# Altium footprint library MyLibrarySum.PcbLib: 208 footprints (part 9 of 13)
Each footprint in its own frame and in the unit in brackets; x right, y up, seen from the top. Pads: shape width x height; smd on the part's side, far side on the other; paste and mask are expansions set on the pad; w line width, h text height; cw(c..) or ccw(c..) is an arc to the next point about the centre after c.
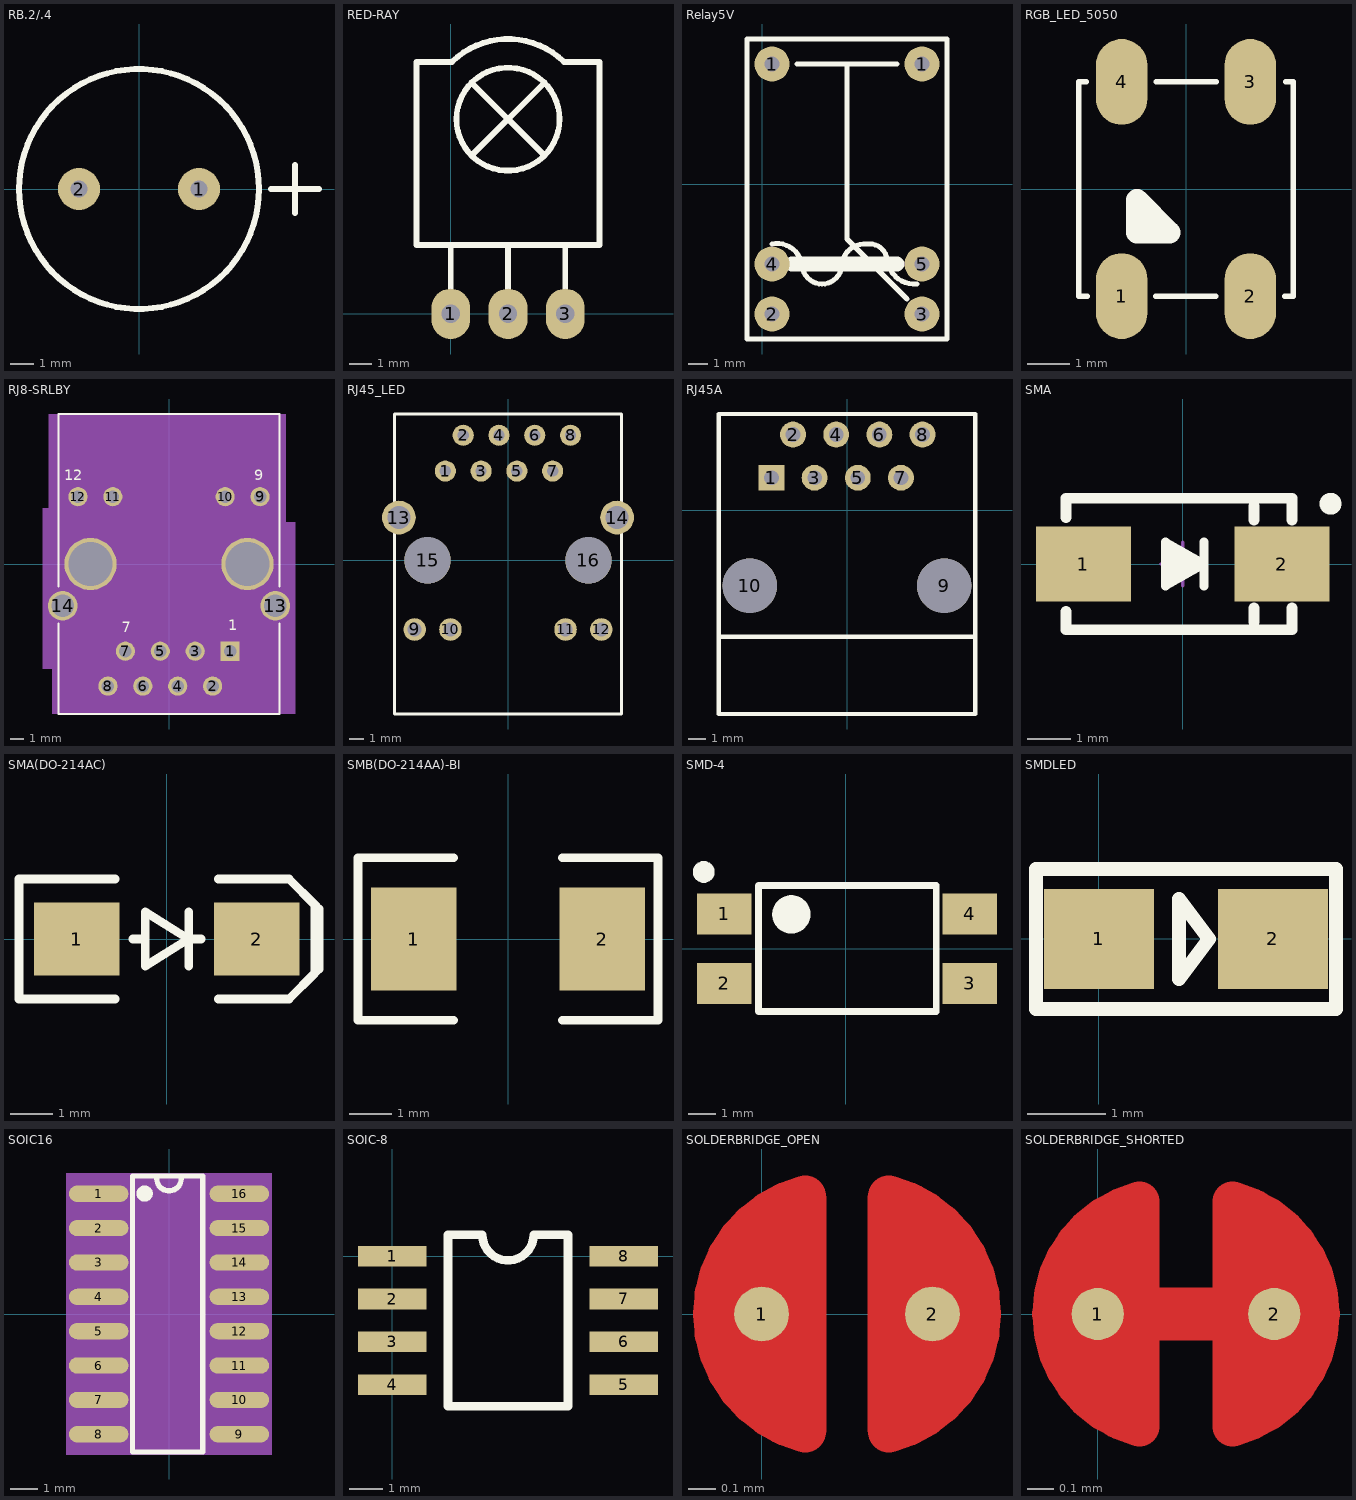
[diagram p8: the footprints below, top view; thin cyan lines are the x and y axes]

## RB.2/.4 [mil]
pads (2):
  round 70 hole 28: 1(100,0) 2(-100,0)
Top Overlay:
  circle w10: c0,0 r200
  lines w10: 220,0 300,0 ; 260,-40 260,40
3D body: height 512.81, standoff -136.91, extent -200,-195.7 195.7,200

## RED-RAY [mm]
pads (3):
  oval 1.7x2.2 hole 0.8: 1(0,0) 2(2.5,0) 3(5,0)
Top Overlay:
  circle w0.254: c2.5,8.5 r2.25
  lines w0.254: 0,1.1 0,3 ; 0.9,6.9 4.1,10.1 ; 0.9,10.1 4.1,6.9 ; 2.5,1.1 2.5,3 ; 4.947,11.002 ccw(c2.5,8.5) 0.053,11.002 -1.501,11.001 -1.5,3 6.5,3 6.5,11 4.948,11.002 ; 5,1.1 5,3

## Relay5V [mil]
pads (6):
  round 70 hole 30: 1(20,240) 1(320,240) 2(20,-260) 3(320,-260) 4(20,-160) 5(320,-160)
Top Overlay:
  lines w10: 20,-120 cw(c30,-170) 80,-160 ccw(c120,-160) 120,-200 ccw(c120,-160) 160,-160 cw(c205,-165) 210,-120 cw(c215,-155) 250,-150 ccw(c305,-145) 310,-200 ; 70,240 270,240 ; 170,240 170,-110 290,-230 ; -30,-310 370,-310 370,290 -30,290 -30,-310
  lines w30: 60,-160 270,-160
3D body: height 0, standoff -566.93, extent -40,-300 373.39,310.24

## RGB_LED_5050 [mm]
pads (4):
  oval 1.2x2 smd: 1(-1.5,-2.5) 2(1.5,-2.5) 3(1.5,2.5) 4(-1.5,2.5)
Top Overlay:
  lines w0.127: -2.326,2.5 -2.5,2.5 -2.5,-2.5 -2.3,-2.5 ; -0.711,-2.5 0.697,-2.5 ; -0.697,2.5 0.711,2.5 ; 2.3,-2.5 2.5,-2.5 2.5,2.5 2.326,2.5
  lines w0.508: -1.143,-1.016 -0.381,-1.016 -1.143,-0.254 -1.143,-1.016
3D body: height 1.55, standoff -0.02, extent -5,-5 5,5

## RJ8-SRLBY [mil] "RJ8-SRLBY"
pads (16):
  rect 55x55 hole 36: 1(175,-250)
  round 55 hole 36: 2(125,-350) 3(75,-250) 4(25,-350) 5(-25,-250) 6(-75,-350) 7(-125,-250) 8(-175,-350) 9(260.98,192.99) 10(160.98,192.99) 11(-160.98,192.99) 12(-260.98,192.99)
  round 85 hole 65: 13(305,-120) 14(-305,-120)
  round 150 hole 126: " "(-225,0) " "(225,0)
Top Overlay:
  lines w5.98: -317.01,-170 -317.01,-430 317.01,-430 317.01,-170 ; -317.01,-65 -317.01,430 317.01,430 317.01,-65
  text "1" at 170,-190 h30
  text "7" at -135,-195 h30
  text "9" at 245,240 h30
  text "12" at -300,240 h30
Mechanical 11:
  text "7" at -125,-240 h25
  text "13" at 305,-100 h25
  text "14" at -305,-100 h25
  text "8" at -175,-340 h25
  text "9" at 260.98,202.99 h25
  text "12" at -260.99,212.99 h25
  text "10" at 160.98,212.99 h25
  text "1" at 175,-240 h25
  text "2" at 125,-340 h25
  text "5" at -25,-240 h25
  text "4" at 25,-340 h25
  text "11" at -160.99,212.99 h25
  text "3" at 75,-240 h25
  text "6" at -75,-340 h25
Mechanical 12:
  lines w5.98: -317.01,-430 -317.01,430 317.01,430 317.01,-430 -317.01,-430
  text ".Designator" at -210,555 h30
Mechanical 13:
  region: -345,430 335,430 335,120 362.01,120 362.01,-430 -335,-430 -335,-300 -362.01,-300 -362.01,160 -345,160

## RJ45_LED [mm]
pads (16):
  round 1.5 hole 0.8: 1(-4.45,6.35) 2(-3.18,8.89) 3(-1.91,6.35) 4(-0.64,8.89) 5(0.63,6.35) 6(1.9,8.89) 7(3.17,6.35) 8(4.44,8.89)
  round 1.6 hole 1: 9(-6.625,-4.9) 10(-4.085,-4.9) 11(4.085,-4.9) 12(6.625,-4.9)
  round 2.4 hole 1.65: 13(-7.745,3.05) 14(7.745,3.05)
  round 3.3 hole 3.3 unplated: 15(-5.715,0) 16(5.715,0)
Top Overlay:
  lines w0.2: -8.05,-10.9 -8.05,10.4 8.05,10.4 8.05,-10.9 -8.05,-10.9
3D body: height 13.5, standoff -3, extent -7.93,-11.005 7.95,10.395

## RJ45A [mil]
pads (10):
  rect 60x60 hole 34 mask+2: 1(-175,75)
  round 60 hole 34 mask+2: 2(-125,175) 3(-75,75) 4(-25,175) 5(25,75) 6(75,175) 7(125,75) 8(175,175)
  round 125.98 hole 125.98 unplated mask+2: 9(225,-175) 10(-225,-175)
Top Overlay:
  lines w10: -297.23,222.65 -297.23,-293.44 297.21,-293.44 297.21,222.65 -297.23,222.65 ; -297.24,222.64 -297.24,-472.24 297.24,-472.24 297.24,222.64 -297.24,222.64
Mechanical 16:
  lines w5: -256.5,-175 cw(c-225,-175) -193.5,-175 cw(c-225,-175) -256.5,-175 ; -175,60.24 cw(c-175,75) -175,89.76 cw(c-175,75) -175,60.24 ; -125,160.24 ccw(c-125,175) -125,189.76 ccw(c-125,175) -125,160.24 ; -75,60.24 ccw(c-75,75) -75,89.76 ccw(c-75,75) -75,60.24 ; -25,160.24 ccw(c-25,175) -25,189.76 ccw(c-25,175) -25,160.24 ; 25,60.24 ccw(c25,75) 25,89.76 ccw(c25,75) 25,60.24 ; 75,160.24 ccw(c75,175) 75,189.76 ccw(c75,175) 75,160.24 ; 125,60.24 ccw(c125,75) 125,89.76 ccw(c125,75) 125,60.24 ; 175,160.24 ccw(c175,175) 175,189.76 ccw(c175,175) 175,160.24 ; 193.5,-175 ccw(c225,-175) 256.5,-175 ccw(c225,-175) 193.5,-175

## SMA [mm] "4.5x2.6*2.2mm（长宽高，不包括引脚）"
height 2.54
pads (2):
  rect 2.2x1.75 smd: 1(-2.3,0) 2(2.3,0)
Top Overlay:
  circle w0.254: c3.429,1.397 r0.127
  lines w0.203: 0.494,-0.508 0.494,0.508 ; -0.395,-0.508 -0.395,0.508 0.494,0 -0.395,-0.508
  lines w0.254: -2.7,-1.105 -2.7,-1.524 2.54,-1.524 2.54,-1.016 ; -2.7,1.08 -2.7,1.524 2.54,1.524 2.54,1.016 ; -0.33,0.305 0.305,0 -0.254,-0.305 -0.254,0.051 0.023,0 ; 1.651,-1.35 1.651,-1.016 ; 1.651,1.016 1.651,1.35
Mechanical 15:
  lines w0.076: -0.508,0 0.494,0 ; 0,-0.508 0,0.508
3D body: height 2.15, standoff 0.04, extent -2.528,-1.3 2.575,1.3

## SMA(DO-214AC) [mm]
height 2.2
pads (2):
  rect 2x1.7 smd: 1(-2.1,0) 2(2.1,0)
Top Overlay:
  lines w0.2: -1.2,-1.4 -3.45,-1.4 -3.45,1.4 -1.2,1.4 ; -0.8,0 -0.508,0 ; 0.508,-0.635 0.508,0.635 ; 0.8,0 0.508,0 ; 1.2,-1.4 2.85,-1.4 3.45,-0.8 3.45,0.8 ; 1.2,1.4 2.85,1.4 3.45,0.8 ; 3.375,-0.875 3.55,-0.7 3.55,0.7 3.45,0.8 ; 0.508,0 -0.508,0.635 -0.508,-0.635 0.508,0
3D body: height 2.7, standoff 0, extent -2.8,-1.475 2.8,1.475

## SMB(DO-214AA)-BI [mm]
pads (2):
  rect 2x2.4 smd: 1(-2.2,0) 2(2.2,0)
Top Overlay:
  lines w0.2: -1.27,-1.9 -3.5,-1.9 -3.5,1.9 -1.27,1.9 ; 1.27,-1.9 3.5,-1.9 3.5,1.9 1.27,1.9
3D body: height 2.3, standoff 0, extent -2.7,-1.8 2.7,1.8

## SMD-4 [mm] "SOP-4_L6.4-W4.6-P2.54-LS10.2-TL"
pads (4):
  rect 2x1.5 smd: 1(-4.445,1.27) 2(-4.445,-1.27) 3(4.521,-1.27) 4(4.521,1.27)
Top Overlay:
  lines w0.254: -3.2,-2.3 -3.2,2.3 3.3,2.3 3.3,-2.3 -3.2,-2.3
  lines w0.4: -5.2,3 ccw(c-5.198,2.8) -5.197,3
  lines w0.7: -1.999,1.6 ccw(c-1.997,1.25) -1.994,1.6

## SMDLED [mm]
pads (2):
  rect 1.4x1.27 smd: 1(0.001,-0.002) 2(2.211,-0.002)
Top Overlay:
  lines w0.178: 3.012,0.887 3.011,0.887 ; 3.011,0.887 -0.799,0.887 -0.799,-0.002 -0.799,-0.891 3.011,-0.891 3.011,0.887 ; 1.017,-0.51 1.398,-0.002 1.017,0.506 1.017,-0.51
3D body: height 1.1, standoff 0, extent 0.133,-0.635 2.153,0.615

## SOIC16 [mm] "SOIC16"
pads (16):
  oval 2.2x0.6 smd: 1(-2.6,4.445) 2(-2.6,3.175) 3(-2.6,1.905) 4(-2.6,0.635) 5(-2.6,-0.635) 6(-2.6,-1.905) 7(-2.6,-3.175) 8(-2.6,-4.445) 9(2.6,-4.445) 10(2.6,-3.175) 11(2.6,-1.905) 12(2.6,-0.635) 13(2.6,0.635) 14(2.6,1.905) 15(2.6,3.175) 16(2.6,4.445)
Top Overlay:
  circle w0.3: c-0.9,4.45 r0.15
  lines w0.2: -0.45,5 ccw(c0,5) 0.45,5 ; -1.35,-5.1 -1.35,5.1 -1.3,5.1 1.25,5.1 1.25,-5.1 -1.35,-5.1
Mechanical 11:
  text "15" at 2.6,2.769 h0.51
  text "14" at 2.6,1.499 h0.51
  text "5" at -2.6,-0.838 h0.51
  text "2" at -2.6,2.972 h0.51
  text "13" at 2.6,0.229 h0.51
  text "4" at -2.6,0.432 h0.51
  text "6" at -2.6,-2.108 h0.51
  text "8" at -2.6,-4.648 h0.51
  text "7" at -2.6,-3.378 h0.51
  text "16" at 2.6,4.039 h0.51
  text "9" at 2.6,-4.648 h0.51
  text "10" at 2.6,-3.581 h0.51
  text "1" at -2.6,4.242 h0.51
  text "12" at 2.6,-1.041 h0.51
  text "11" at 2.6,-2.311 h0.51
  text "3" at -2.6,1.702 h0.51
Mechanical 13:
  region: -3.8,-5.2 3.8,-5.2 3.8,5.2 -3.8,5.2
3D body: height 1.95, standoff 0, extent -3.008,-5.15 3.048,5.15

## SOIC-8 [mil]
pads (8):
  rect 80x24 smd: 1(0,0) 2(0,-50.06) 3(0,-100.06) 4(0,-150.06) 5(270,-150) 6(270,-100) 7(270,-50) 8(270,0)
Top Overlay:
  lines w10: 75,24.94 75.06,25 105,25 ccw(c135,25) 165,25 204.94,25 205,24.94 205,-175.06 65,-175.06 65,24.94 95,24.94
3D body: height 62.99, standoff 0, extent 6.07,-172.64 243.93,25

## SOLDERBRIDGE_OPEN [mm]
pads (2):
  round 0.2 smd paste-10: 1(0,0) 2(0.625,0)
Top Layer:
  region: 0.236,-0.432 0.16,-0.505 0.042,-0.467 -0.023,-0.424 -0.097,-0.351 -0.15,-0.292 -0.208,-0.193 -0.236,-0.099 -0.231,0.122 -0.206,0.193 -0.122,0.33 -0.038,0.411 0.054,0.469 0.155,0.5 0.206,0.483 0.236,0.43
  region: 0.389,0.432 0.465,0.505 0.583,0.467 0.648,0.424 0.721,0.351 0.775,0.292 0.833,0.193 0.861,0.099 0.856,-0.122 0.831,-0.193 0.747,-0.33 0.663,-0.411 0.571,-0.469 0.47,-0.5 0.419,-0.483 0.389,-0.43
  lines w0.152: 0.159,-0.431 cw(c0.27,0) -0.175,0 cw(c0.27,0) 0.159,0.431 ; 0.465,-0.431 ccw(c0.355,0) 0.799,0 ccw(c0.355,0) 0.465,0.431
Top Solder:
  circle w0.61: c0.31,0 r0.279

## SOLDERBRIDGE_SHORTED [mm]
pads (2):
  round 0.2 smd paste-10: 1(0,0) 2(0.676,0)
Top Layer:
  region: 0.236,-0.432 0.16,-0.505 0.042,-0.467 -0.023,-0.424 -0.097,-0.351 -0.15,-0.292 -0.208,-0.193 -0.236,-0.099 -0.231,0.122 -0.206,0.193 -0.122,0.33 -0.038,0.411 0.054,0.469 0.155,0.5 0.206,0.483 0.236,0.43
  region: 0.44,0.432 0.516,0.505 0.634,0.467 0.699,0.424 0.772,0.351 0.826,0.292 0.884,0.193 0.912,0.099 0.907,-0.122 0.881,-0.193 0.798,-0.33 0.714,-0.411 0.622,-0.469 0.521,-0.5 0.47,-0.483 0.44,-0.43
  lines w0.152: 0.159,-0.431 cw(c0.27,0) -0.175,0 cw(c0.27,0) 0.159,0.431 ; 0.516,-0.431 ccw(c0.406,0) 0.516,0.431
  lines w0.203: 0,0 0.676,0
Top Solder:
  circle w0.61: c0.366,0 r0.279
  circle w0.61: c0.31,0 r0.279